# Altium footprint library Inductors SMD.PcbLib: 145 footprints (part 5 of 10)
Each footprint in its own frame and in the unit in brackets; x right, y up, seen from the top. Pads: shape width x height; smd on the part's side, far side on the other; paste and mask are expansions set on the pad; w line width, h text height; cw(c..) or ccw(c..) is an arc to the next point about the centre after c.
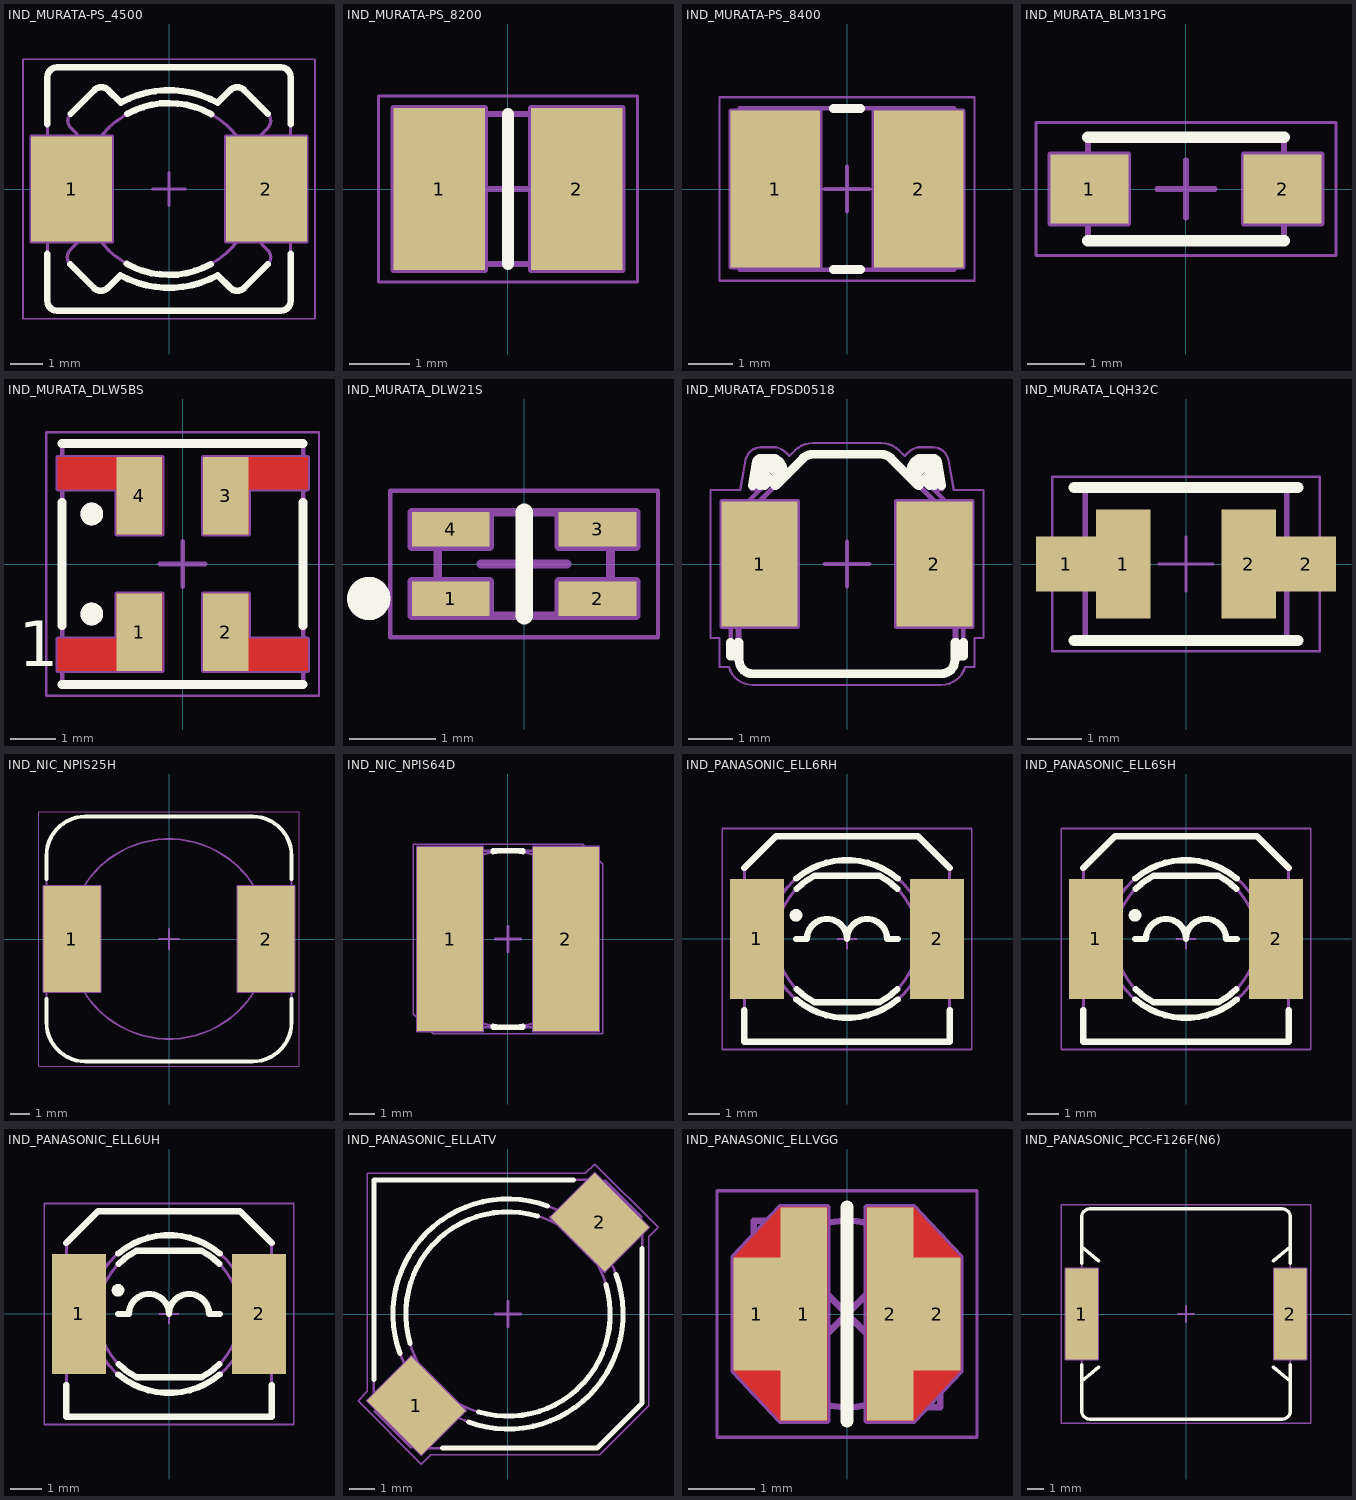
[diagram p4: the footprints below, top view; thin cyan lines are the x and y axes]

## IND_MURATA-PS_4500 [mm] "Shielded Surface Mount Power Inductors, 7.3mm L X 7.3mm W X 3.55mm H, MURATA 4500 Series"
height 3.55
pads (2):
  rect 2.5x3.25 smd: 1(-3,0) 2(3,0)
Top Overlay:
  lines w0.2: -3.75,-2 -3.75,-3.45 ccw(c-3.45,-3.45) -3.45,-3.75 3.45,-3.75 ccw(c3.45,-3.45) 3.75,-3.45 3.75,-2 ; -3.75,2 -3.75,3.45 cw(c-3.45,3.45) -3.45,3.75 3.45,3.75 cw(c3.45,3.45) 3.75,3.45 3.75,2 ; -3.045,-2.323 -2.323,-3.045 ccw(c-2.103,-2.826) -1.883,-3.045 -1.496,-2.658 ccw(c0,0) 1.496,-2.658 1.879,-3.04 ccw(c2.104,-2.825) 2.323,-3.045 3.045,-2.323 ; -3.029,2.323 -2.307,3.045 cw(c-2.087,2.826) -1.863,3.041 -1.486,2.664 cw(c0,0) 1.496,2.658 1.883,3.045 cw(c2.103,2.826) 2.323,3.045 3.045,2.323 ; -1.3,-2.309 ccw(c0,0) 1.291,-2.314 ; -1.291,2.314 cw(c0,0) 1.3,2.309
Top Solder:
  region: 2.85,0.6 1.7,0.6 1.7,-0.6 2.85,-0.6
  rectangle: -2.85,-0.6 -1.7,0.6
Mechanical 8:
  lines w0.1: -3.5,0 -3,0 ; -3,-0.5 -3,0 ; -3,0.5 -3,0 ; -2.5,0 -3,0 ; -0.5,0 0,0 ; 0,-0.5 0,0 ; 0,0.5 0,0 ; 0.5,0 0,0 ; 2.5,0 3,0 ; 3,-0.5 3,0 ; 3,0.5 3,0 ; 3.5,0 3,0 ; -4.25,-1.625 -1.75,-1.625 -1.75,1.625 -4.25,1.625 -4.25,-1.625 ; 1.75,-1.625 1.75,1.625 4.25,1.625 4.25,-1.625 1.75,-1.625
Mechanical 14:
  circle w0.1: c0,0 r2.65
  lines w0.1: -1.5,3.75 1.5,3.75 ; -3.75,-3.45 ccw(c-3.45,-3.45) -3.45,-3.75 3.45,-3.75 ccw(c3.45,-3.45) 3.75,-3.45 3.75,3.45 ccw(c3.45,3.45) 3.45,3.75 -3.45,3.75 ccw(c-3.45,3.45) -3.75,3.45 -3.75,-3.45 ; -3.045,-2.323 cw(c-2.825,-2.104) -3.04,-1.879 -2.658,-1.496 cw(c0,0) -2.652,1.506 -3.029,1.884 cw(c-2.809,2.103) -3.029,2.323 -2.307,3.045 cw(c-2.087,2.826) -1.863,3.041 -1.486,2.664 cw(c0,0) 1.496,2.658 1.883,3.045 cw(c2.103,2.826) 2.323,3.045 3.045,2.323 cw(c2.825,2.104) 3.04,1.879 2.658,1.496 cw(c0,0) 2.658,-1.496 3.045,-1.883 cw(c2.826,-2.103) 3.045,-2.323 2.323,-3.045 cw(c2.104,-2.825) 1.879,-3.04 1.496,-2.658 cw(c0,0) -1.496,-2.658 -1.883,-3.045 cw(c-2.103,-2.826) -2.323,-3.045 -3.045,-2.323
Mechanical 15:
  lines w0.05: -4.5,-4 4.5,-4 4.5,4 -4.5,4 -4.5,-4
3D body "IND_MURATA-PS_4500.stp": height 3.55, standoff 0, extent -3.75,-3.75 3.75,3.75

## IND_MURATA-PS_8200 [mm] "Miniature Surface Mount Power Inductors, 3.2mm L X 2.5mm W X 2.3mm H, MURATA 8200 Series"
height 2.3
pads (2):
  rect 1.52x2.7 smd: 1(-1.145,0) 2(1.145,0)
Top Overlay:
  lines w0.2: 0,-1.25 0,1.25
Mechanical 8:
  lines w0.1: -1.645,0 -1.145,0 ; -1.145,-0.5 -1.145,0 ; -1.145,0.5 -1.145,0 ; -0.645,0 -1.145,0 ; -0.5,0 0,0 ; 0,-0.5 0,0 ; 0,0.5 0,0 ; 0.5,0 0,0 ; 0.645,0 1.145,0 ; 1.145,-0.5 1.145,0 ; 1.145,0.5 1.145,0 ; 1.645,0 1.145,0 ; -1.905,-1.35 -1.905,1.35 -0.385,1.35 -0.385,-1.35 -1.905,-1.35 ; 0.385,-1.35 0.385,1.35 1.905,1.35 1.905,-1.35 0.385,-1.35
Mechanical 14:
  lines w0.1: -1.193,-1.25 cw(c-1.193,-1.15) -1.293,-1.15 -1.293,1.15 cw(c-1.193,1.15) -1.193,1.25 ; 1.193,-1.25 ccw(c1.193,-1.15) 1.293,-1.15 1.293,1.15 ccw(c1.193,1.15) 1.193,1.25 ; -1.6,-1.25 -1.6,1.25 1.6,1.25 1.6,-1.25 -1.6,-1.25
Mechanical 15:
  lines w0.05: -2.155,-1.55 2.155,-1.55 2.155,1.55 -2.155,1.55 -2.155,-1.55
3D body "IND_MURATA-PS_8200.stp": height 2.3, standoff 0, extent -1.6,-1.25 1.6,1.25

## IND_MURATA-PS_8400 [mm] "Miniature Surface Mount Power Inductors, 4.5mm L X 3.3mm W X 2.9mm H, MURATA 8400 Series"
height 2.9
pads (2):
  rect 2x3.5 smd: 1(-1.6,0) 2(1.6,0)
Top Overlay:
  lines w0.2: -0.3,-1.8 0.3,-1.8 ; -0.3,1.8 0.3,1.8
Mechanical 8:
  lines w0.1: -2.1,0 -1.6,0 ; -1.6,-0.5 -1.6,0 ; -1.6,0.5 -1.6,0 ; -1.1,0 -1.6,0 ; -0.5,0 0,0 ; 0,-0.5 0,0 ; 0,0.5 0,0 ; 0.5,0 0,0 ; 1.1,0 1.6,0 ; 1.6,-0.5 1.6,0 ; 1.6,0.5 1.6,0 ; 2.1,0 1.6,0 ; -2.6,-1.75 -0.6,-1.75 -0.6,1.75 -2.6,1.75 -2.6,-1.75 ; 0.6,-1.75 2.6,-1.75 2.6,1.75 0.6,1.75 0.6,-1.75
Mechanical 14:
  lines w0.1: -1.8,-1.8 -1.8,1.8 ; 1.8,-1.8 1.8,1.8 ; -2.4,-1.8 -2.4,1.8 2.4,1.8 2.4,-1.8 -2.4,-1.8
Mechanical 15:
  lines w0.05: -2.85,-2.05 2.85,-2.05 2.85,2.05 -2.85,2.05 -2.85,-2.05
3D body "IND_MURATA-PS_8400.stp": height 2.9, standoff 0, extent -2.4,-1.8 2.4,1.8

## IND_MURATA_BLM31PG [mm] "Chip Ferrite Bead, 3.20mm L X 1.60mm W, BLM31PG Series"
height 1.3
pads (2):
  rect 1.35x1.2 smd: 1(-1.675,0) 2(1.675,0)
Top Overlay:
  lines w0.2: -1.7,-0.9 1.7,-0.9 ; -1.7,0.9 1.7,0.9
Mechanical 8:
  lines w0.1: -2.175,0 -1.675,0 ; -1.675,-0.5 -1.675,0 ; -1.675,0.5 -1.675,0 ; -1.175,0 -1.675,0 ; -0.5,0 0,0 ; 0,-0.5 0,0 ; 0,0.5 0,0 ; 0.5,0 0,0 ; 1.175,0 1.675,0 ; 1.675,-0.5 1.675,0 ; 1.675,0.5 1.675,0 ; 2.175,0 1.675,0 ; -2.35,-0.6 -1,-0.6 -1,0.6 -2.35,0.6 -2.35,-0.6 ; 1,-0.6 2.35,-0.6 2.35,0.6 1,0.6 1,-0.6
Mechanical 14:
  lines w0.1: -1.7,-0.9 -1.7,0.9 1.7,0.9 1.7,-0.9 -1.7,-0.9
Mechanical 15:
  lines w0.05: -2.6,-1.15 -2.6,1.15 2.6,1.15 2.6,-1.15 -2.6,-1.15
3D body "IND_MURATA_BLM31PG.stp": height 1.3, standoff 0, extent -1.6,-0.8 1.6,0.8

## IND_MURATA_DLW5BS [mm] "Common Mode Choke Coil, DLW5BS Series - Body 5.0 x 5.0mm"
height 4.5
pads (4):
  rect 1x1.7 smd: 1(-0.95,-1.5) 2(0.95,-1.5) 3(0.95,1.5) 4(-0.95,1.5)
Top Layer:
  region: -0.45,0.65 -0.45,2.35 -2.75,2.35 -2.75,1.65 -1.45,1.65 -1.45,0.65
  region: 0.45,-0.65 0.45,-2.35 2.75,-2.35 2.75,-1.65 1.45,-1.65 1.45,-0.65
  region: -0.45,-0.65 -0.45,-2.35 -2.75,-2.35 -2.75,-1.65 -1.45,-1.65 -1.45,-0.65
  region: 0.45,0.65 0.45,2.35 2.75,2.35 2.75,1.65 1.45,1.65 1.45,0.65
Top Overlay:
  circle w0.25: c-2,1.1 r0.125
  circle w0.25: c-2,-1.1 r0.125
  lines w0.2: -2.65,-2.65 2.65,-2.65 ; -2.65,-1.35 -2.65,1.35 ; -2.65,2.65 2.65,2.65 ; 2.65,-1.35 2.65,1.35
  text "1" at -3.6,-2.25 h1
Mechanical 8:
  lines w0.1: -1.45,-1.5 -0.95,-1.5 ; -1.45,1.5 -0.95,1.5 ; -0.95,-2 -0.95,-1.5 ; -0.95,-1 -0.95,-1.5 ; -0.95,1 -0.95,1.5 ; -0.95,2 -0.95,1.5 ; -0.5,0 0,0 ; -0.45,-1.5 -0.95,-1.5 ; -0.45,1.5 -0.95,1.5 ; 0,-0.5 0,0 ; 0,0.5 0,0 ; 0.45,-1.5 0.95,-1.5 ; 0.45,1.5 0.95,1.5 ; 0.5,0 0,0 ; 0.95,-2 0.95,-1.5 ; 0.95,-1 0.95,-1.5 ; 0.95,1 0.95,1.5 ; 0.95,2 0.95,1.5 ; 1.45,-1.5 0.95,-1.5 ; 1.45,1.5 0.95,1.5 ; -2.75,-2.35 -0.45,-2.35 -0.45,-0.65 -1.45,-0.65 -1.45,-1.65 -2.75,-1.65 -2.75,-2.35 ; -2.75,1.65 -1.45,1.65 -1.45,0.65 -0.45,0.65 -0.45,2.35 -2.75,2.35 -2.75,1.65 ; 0.45,-2.35 0.45,-0.65 1.45,-0.65 1.45,-1.65 2.75,-1.65 2.75,-2.35 0.45,-2.35 ; 0.45,0.65 1.45,0.65 1.45,1.65 2.75,1.65 2.75,2.35 0.45,2.35 0.45,0.65
Mechanical 14:
  circle w0.25: c-2,-1.1 r0.125
  circle w0.25: c-2,1.1 r0.125
  lines w0.1: -2.65,-2.65 2.65,-2.65 2.65,2.65 -2.65,2.65 -2.65,-2.65
Mechanical 15:
  lines w0.05: -3,-2.9 3,-2.9 3,2.9 -3,2.9 -3,-2.9
3D body "IND_MURATA_DLW5BS.stp": height 4.5, standoff 0, extent -2.65,-2.65 2.65,2.65

## IND_MURATA_DLW21S [mm] "Common Mode Choke Coil, DLW21S Series - Body 2 x 1.2mm"
height 1.4
pads (4):
  rect 0.9x0.4 smd: 1(-0.85,-0.4) 2(0.85,-0.4) 3(0.85,0.4) 4(-0.85,0.4)
Top Overlay:
  circle w0.25: c-1.8,-0.4 r0.125
  lines w0.2: 0,-0.6 0,0.6
Mechanical 8:
  lines w0.1: -0.5,0 0,0 ; 0,-0.5 0,0 ; 0,0.5 0,0 ; 0.5,0 0,0 ; -1.3,-0.6 -0.4,-0.6 -0.4,-0.2 -1.3,-0.2 ; -1.3,-0.6 -1.3,-0.2 ; -1.3,-0.6 -0.85,-0.4 -1.3,-0.2 ; -1.3,0.2 -0.4,0.2 -0.4,0.6 -1.3,0.6 ; -1.3,0.2 -1.3,0.6 ; -1.3,0.2 -0.85,0.4 -1.3,0.6 ; 1.3,-0.6 1.3,-0.2 ; 1.3,-0.6 1.3,-0.2 ; 1.3,-0.6 0.4,-0.6 0.4,-0.2 1.3,-0.2 ; 1.3,-0.6 0.85,-0.4 1.3,-0.2 ; 1.3,0.2 1.3,0.6 ; 1.3,0.2 1.3,0.6 ; 1.3,0.2 0.4,0.2 0.4,0.6 1.3,0.6 ; 1.3,0.2 0.85,0.4 1.3,0.6
Mechanical 14:
  circle w0.25: c-1.8,-0.4 r0.125
  lines w0.1: -1,-0.6 1,-0.6 1,0.6 -1,0.6 -1,-0.6
Mechanical 15:
  lines w0.05: -1.55,-0.85 1.55,-0.85 1.55,0.85 -1.55,0.85 -1.55,-0.85
3D body "IND_MURATA_DLW21S.stp": height 1.4, standoff 0, extent -1,-0.6 1,0.6

## IND_MURATA_FDSD0518 [mm] "Surface Mount Metal alloy Power Inductor, 5.2mm L X 4.9mm W X 1.8mm H, FDSD0518 Series"
height 1.8
pads (2):
  rect 1.7x2.8 smd: 1(-1.95,0) 2(1.95,0)
Top Overlay:
  lines w0.2: -2.6,-1.75 -2.6,-2.05 -2.436,-2.05 -2.436,-1.75 ; -2.408,-1.75 -2.408,-2.151 ccw(c-2.108,-2.151) -2.111,-2.451 2.108,-2.451 ccw(c2.108,-2.151) 2.408,-2.151 2.408,-1.75 ; -2.111,1.75 -2.018,2.276 cw(c-1.919,2.259) -1.92,2.359 -1.638,2.36 cw(c-1.638,2.26) -1.578,2.34 -1.548,2.317 cw(c-1.737,2.065) -1.459,1.917 ; -1.946,1.75 -1.89,2.128 cw(c-1.791,2.113) -1.791,2.213 -1.71,2.213 cw(c-1.71,2.113) -1.64,2.184 -1.629,2.174 cw(c-1.735,2.067) -1.587,2.045 ; -1.845,1.75 -1.708,1.883 ; -1.609,1.75 -1.592,1.767 ; -1.596,1.75 -0.982,2.363 cw(c-0.77,2.151) -0.77,2.451 0.77,2.451 cw(c0.77,2.151) 0.982,2.363 1.596,1.75 ; -1.585,1.76 -1.822,1.997 cw(c-1.752,2.068) -1.681,2.139 -1.444,1.902 ; 1.444,1.902 1.681,2.139 cw(c1.752,2.068) 1.822,1.997 1.585,1.76 ; 1.459,1.917 cw(c1.737,2.065) 1.548,2.317 1.578,2.34 cw(c1.638,2.26) 1.638,2.36 1.92,2.359 cw(c1.919,2.259) 2.018,2.276 2.111,1.75 ; 1.587,2.045 cw(c1.735,2.067) 1.629,2.174 1.64,2.184 cw(c1.71,2.113) 1.71,2.213 1.791,2.213 cw(c1.791,2.113) 1.89,2.128 1.946,1.75 ; 1.592,1.767 1.609,1.75 ; 1.708,1.883 1.845,1.75 ; 2.436,-1.75 2.436,-2.05 2.6,-2.05 2.6,-1.75
Mechanical 8:
  lines w0.1: -2.45,0 -1.95,0 ; -1.95,-0.5 -1.95,0 ; -1.95,0.5 -1.95,0 ; -1.45,0 -1.95,0 ; -0.5,0 0,0 ; 0,-0.5 0,0 ; 0,0.5 0,0 ; 0.5,0 0,0 ; 1.45,0 1.95,0 ; 1.95,-0.5 1.95,0 ; 1.95,0.5 1.95,0 ; 2.45,0 1.95,0 ; -2.8,-1.4 -1.1,-1.4 -1.1,1.4 -2.8,1.4 -2.8,-1.4 ; 1.1,-1.4 2.8,-1.4 2.8,1.4 1.1,1.4 1.1,-1.4
Mechanical 14:
  lines w0.1: -1.708,1.883 -2.6,1.011 -2.6,-2.05 -2.436,-2.05 -2.436,0.938 -1.592,1.767 ; -1.587,2.045 ccw(c-1.735,2.067) -1.629,2.174 -1.64,2.184 ccw(c-1.71,2.113) -1.71,2.213 -1.791,2.213 ccw(c-1.791,2.113) -1.89,2.128 -1.961,1.649 -2.126,1.667 -2.018,2.276 cw(c-1.919,2.259) -1.92,2.359 -1.638,2.36 cw(c-1.638,2.26) -1.578,2.34 -1.548,2.317 cw(c-1.737,2.065) -1.459,1.917 ; -1.585,1.76 -1.822,1.997 cw(c-1.752,2.068) -1.681,2.139 -1.444,1.902 ; 1.444,1.902 1.681,2.139 cw(c1.752,2.068) 1.822,1.997 1.585,1.76 ; 1.459,1.917 cw(c1.737,2.065) 1.548,2.317 1.578,2.34 cw(c1.638,2.26) 1.638,2.36 1.92,2.359 cw(c1.919,2.259) 2.018,2.276 2.126,1.667 1.961,1.649 1.89,2.128 ccw(c1.791,2.113) 1.791,2.213 1.71,2.213 ccw(c1.71,2.113) 1.64,2.184 1.629,2.174 ccw(c1.735,2.067) 1.587,2.045 ; 1.592,1.767 2.436,0.938 2.436,-2.05 2.6,-2.05 2.6,1.011 1.708,1.883 ; -2.408,-2.151 ccw(c-2.108,-2.151) -2.111,-2.451 2.108,-2.451 ccw(c2.108,-2.151) 2.408,-2.151 2.408,0.814 ccw(c2.108,0.814) 2.32,1.026 0.982,2.363 ccw(c0.77,2.151) 0.77,2.451 -0.77,2.451 ccw(c-0.77,2.151) -0.982,2.363 -2.32,1.026 ccw(c-2.106,0.813) -2.408,0.814 -2.408,-2.151
Mechanical 15:
  lines w0.05: -3.05,-1.65 -2.85,-1.65 -2.85,-2.3 -2.638,-2.3 ccw(c-2.108,-2.151) -2.112,-2.701 2.108,-2.701 ccw(c2.108,-2.151) 2.638,-2.3 2.85,-2.3 2.85,-1.65 3.05,-1.65 3.05,1.65 2.383,1.65 2.264,2.32 ccw(c1.919,2.259) 1.92,2.609 1.639,2.61 ccw(c1.638,2.26) 1.428,2.539 1.398,2.517 ccw(c1.737,2.065) 1.289,2.409 1.159,2.54 ccw(c0.77,2.151) 0.77,2.701 -0.77,2.701 ccw(c-0.77,2.151) -1.159,2.54 -1.289,2.409 ccw(c-1.737,2.065) -1.397,2.517 -1.428,2.539 ccw(c-1.638,2.26) -1.638,2.61 -1.92,2.609 ccw(c-1.919,2.259) -2.264,2.32 -2.383,1.65 -3.05,1.65 -3.05,-1.65
3D body "IND_MURATA_FDSD0518.stp": height 1.8, standoff 0, extent -2.6,-2.451 2.6,2.451

## IND_MURATA_LQH32C [mm] "Chip Inductor, 3.40mm L X 2.50mm W X 2.20mm H, MURATA LQH32 Series"
height 2.2
pads (4):
  rect 1.1x1 smd: 1(-2.2,0) 2(2.2,0)
  rect 1x2 smd: 1(-1.15,0) 2(1.15,0)
Top Overlay:
  lines w0.2: -2.05,-1.4 2.05,-1.4 ; -2.05,1.4 2.05,1.4
Mechanical 14:
  lines w0.1: -1.85,-1.35 1.85,-1.35 1.85,1.35 -1.85,1.35 -1.85,-1.35
Mechanical 15:
  lines w0.05: -0.5,0 0.5,0 ; 0,-0.5 0,0.5 ; -2.45,-1.6 2.45,-1.6 2.45,1.6 -2.45,1.6 -2.45,-1.6
3D body "IND_MURATA_LQH32C.stp": height 2.2, standoff 0, extent -1.75,-1.25 1.75,1.25

## IND_NIC_NPIS25H [mm] "Power-Choke Inductor, Body 12.5x12.5mm, NIC NPIS_H Series"
height 6
pads (2):
  rect 2.9x5.4 smd: 1(-4.95,0) 2(4.95,0)
Top Overlay:
  lines w0.2: -6.25,-3.05 -6.25,-4.25 ccw(c-4.25,-4.25) -4.25,-6.25 4.25,-6.25 ccw(c4.25,-4.25) 6.25,-4.25 6.25,-3.05 ; -6.25,3.05 -6.25,4.25 cw(c-4.25,4.25) -4.25,6.25 4.25,6.25 cw(c4.25,4.25) 6.25,4.25 6.25,3.05
Mechanical 8:
  lines w0.1: -5.45,0 -4.95,0 ; -4.95,-0.5 -4.95,0 ; -4.95,0.5 -4.95,0 ; -4.45,0 -4.95,0 ; -0.5,0 0,0 ; 0,-0.5 0,0 ; 0,0.5 0,0 ; 0.5,0 0,0 ; 4.45,0 4.95,0 ; 4.95,-0.5 4.95,0 ; 4.95,0.5 4.95,0 ; 5.45,0 4.95,0 ; -6.4,-2.7 -6.4,2.7 -3.5,2.7 -3.5,-2.7 -6.4,-2.7 ; 3.5,-2.7 6.4,-2.7 6.4,2.7 3.5,2.7 3.5,-2.7
Mechanical 14:
  circle w0.1: c0,0 r5.099
  lines w0.1: -6.25,-4.25 ccw(c-4.25,-4.25) -4.25,-6.25 4.25,-6.25 ccw(c4.25,-4.25) 6.25,-4.25 6.25,4.25 ccw(c4.25,4.25) 4.25,6.25 -4.25,6.25 ccw(c-4.25,4.25) -6.25,4.25 -6.25,-4.25
Mechanical 15:
  lines w0.05: -6.65,-6.5 6.65,-6.5 6.65,6.5 -6.65,6.5 -6.65,-6.5
3D body "IND_NIC_NPIS25H.stp": height 6, standoff 0, extent -6.25,-6.25 6.25,6.25

## IND_NIC_NPIS64D [mm] "Shielded Power Inductor, Body 6.7x6.7mm, NIC NPIS64D Series"
height 4
pads (2):
  rect 2.6x7.3 smd: 1(-2.3,0) 2(2.3,0)
Top Overlay:
  lines w0.2: -0.6,-3.5 0.6,-3.5 ; -0.6,-3.448 ccw(c0,0) 0.6,-3.448 ; -0.6,3.448 cw(c0,0) 0.6,3.448 ; -0.6,3.5 0.6,3.5
Mechanical 8:
  lines w0.1: -2.8,0 -2.3,0 ; -2.3,-0.5 -2.3,0 ; -2.3,0.5 -2.3,0 ; -1.8,0 -2.3,0 ; -0.5,0 0,0 ; 0,-0.5 0,0 ; 0,0.5 0,0 ; 0.5,0 0,0 ; 1.8,0 2.3,0 ; 2.3,-0.5 2.3,0 ; 2.3,0.5 2.3,0 ; 2.8,0 2.3,0 ; -3.6,-3.65 -3.6,3.65 -1,3.65 -1,-3.65 -3.6,-3.65 ; 1,-3.65 1,3.65 3.6,3.65 3.6,-3.65 1,-3.65
Mechanical 14:
  circle w0.1: c0,0 r3.5
  lines w0.1: -3.5,-2.864 -3.5,3.5 2.864,3.5 3.5,2.864 3.5,-3.5 -2.864,-3.5 -3.5,-2.864
Mechanical 15:
  lines w0.05: -3.75,-2.968 -3.75,3.75 2.968,3.75 3.75,2.968 3.75,-3.75 -2.967,-3.75 -3.75,-2.968
3D body "IND_NIC_NPIS64D.stp": height 4, standoff 0, extent -3.5,-3.5 3.5,3.5

## IND_PANASONIC_ELL6RH [mm] "SMD Choke Coil, Body 6.9x6.5mm"
height 2.8
pads (2):
  rect 1.7x3.8 smd: 1(-2.85,0) 2(2.85,0)
Top Overlay:
  circle w0.2: c-1.615,0.75 r0.1
  lines w0.2: -3.25,-2.25 -3.25,-3.25 3.25,-3.25 3.25,-2.25 ; -3.25,2.25 -2.25,3.25 2.25,3.25 3.25,2.25 ; -1.615,0 -1.27,0 cw(c-0.635,0) 0,0 cw(c0.635,0) 1.27,0 1.615,0 ; -1.607,-1.915 ccw(c0,0) 1.607,-1.915 ; -1.607,1.915 cw(c0,0) 1.607,1.915 ; -1.591,-1.591 ccw(c0,0) -1.031,-2 1.031,-2 ccw(c0,0) 1.591,-1.591 ; -1.591,1.591 cw(c0,0) -1.031,2 1.031,2 cw(c0,0) 1.591,1.591
Mechanical 14:
  circle w0.1: c0,0 r2.5
  lines w0.1: -3.25,-1.65 -3.45,-1.65 -3.45,1.65 -3.25,1.65 ; 3.25,-1.65 3.45,-1.65 3.45,1.65 3.25,1.65 ; -3.25,-3.25 3.25,-3.25 3.25,2.25 2.25,3.25 -2.25,3.25 -3.25,2.25 -3.25,-3.25 ; -1.031,-2 cw(c0,0) -1.031,2 1.031,2 cw(c0,0) 1.031,-2 -1.031,-2
Mechanical 15:
  lines w0.05: -0.3,0 0.3,0 ; 0,-0.3 0,0.3 ; -3.95,-3.5 3.95,-3.5 3.95,3.5 -3.95,3.5 -3.95,-3.5
3D body "IND_PANASONIC_ELL6RH.stp": height 2.8, standoff 0, extent -3.45,-3.25 3.45,3.25

## IND_PANASONIC_ELL6SH [mm] "SMD Choke Coil, Body 6.9x6.5mm"
height 3.3
pads (2):
  rect 1.7x3.8 smd: 1(-2.85,0) 2(2.85,0)
Top Overlay:
  circle w0.2: c-1.615,0.75 r0.1
  lines w0.2: -3.25,-2.25 -3.25,-3.25 3.25,-3.25 3.25,-2.25 ; -3.25,2.25 -2.25,3.25 2.25,3.25 3.25,2.25 ; -1.615,0 -1.27,0 cw(c-0.635,0) 0,0 cw(c0.635,0) 1.27,0 1.615,0 ; -1.607,-1.915 ccw(c0,0) 1.607,-1.915 ; -1.607,1.915 cw(c0,0) 1.607,1.915 ; -1.591,-1.591 ccw(c0,0) -1.031,-2 1.031,-2 ccw(c0,0) 1.591,-1.591 ; -1.591,1.591 cw(c0,0) -1.031,2 1.031,2 cw(c0,0) 1.591,1.591
Mechanical 14:
  circle w0.1: c0,0 r2.5
  lines w0.1: -3.25,-1.65 -3.45,-1.65 -3.45,1.65 -3.25,1.65 ; 3.25,-1.65 3.45,-1.65 3.45,1.65 3.25,1.65 ; -3.25,-3.25 3.25,-3.25 3.25,2.25 2.25,3.25 -2.25,3.25 -3.25,2.25 -3.25,-3.25 ; -1.031,-2 cw(c0,0) -1.031,2 1.031,2 cw(c0,0) 1.031,-2 -1.031,-2
Mechanical 15:
  lines w0.05: -0.3,0 0.3,0 ; 0,-0.3 0,0.3 ; -3.95,-3.5 3.95,-3.5 3.95,3.5 -3.95,3.5 -3.95,-3.5
3D body "IND_PANASONIC_ELL6SH.stp": height 3.3, standoff 0, extent -3.45,-3.25 3.45,3.25

## IND_PANASONIC_ELL6UH [mm] "SMD Choke Coil, Body 6.9x6.5mm"
height 5
pads (2):
  rect 1.7x3.8 smd: 1(-2.85,0) 2(2.85,0)
Top Overlay:
  circle w0.2: c-1.615,0.75 r0.1
  lines w0.2: -3.25,-2.25 -3.25,-3.25 3.25,-3.25 3.25,-2.25 ; -3.25,2.25 -2.25,3.25 2.25,3.25 3.25,2.25 ; -1.615,0 -1.27,0 cw(c-0.635,0) 0,0 cw(c0.635,0) 1.27,0 1.615,0 ; -1.607,-1.915 ccw(c0,0) 1.607,-1.915 ; -1.607,1.915 cw(c0,0) 1.607,1.915 ; -1.591,-1.591 ccw(c0,0) -1.031,-2 1.031,-2 ccw(c0,0) 1.591,-1.591 ; -1.591,1.591 cw(c0,0) -1.031,2 1.031,2 cw(c0,0) 1.591,1.591
Mechanical 14:
  circle w0.1: c0,0 r2.5
  lines w0.1: -3.25,-1.65 -3.45,-1.65 -3.45,1.65 -3.25,1.65 ; 3.25,-1.65 3.45,-1.65 3.45,1.65 3.25,1.65 ; -3.25,-3.25 3.25,-3.25 3.25,2.25 2.25,3.25 -2.25,3.25 -3.25,2.25 -3.25,-3.25 ; -1.031,-2 cw(c0,0) -1.031,2 1.031,2 cw(c0,0) 1.031,-2 -1.031,-2
Mechanical 15:
  lines w0.05: -0.3,0 0.3,0 ; 0,-0.3 0,0.3 ; -3.95,-3.5 3.95,-3.5 3.95,3.5 -3.95,3.5 -3.95,-3.5
3D body "IND_PANASONIC_ELL6UH.stp": height 5, standoff 0, extent -3.45,-3.25 3.45,3.25

## IND_PANASONIC_ELLATV [mm] "SMD Wire Wound Power Inductor, Body 10x10mm, ELLATV Series"
height 4.5
pads (2):
  rect 2.45x3 smd rot 45: 1(-3.589,-3.589) 2(3.589,3.589)
Top Overlay:
  lines w0.2: -5.25,-2.563 -5.25,5.25 2.563,5.25 ; -4.228,-1.541 cw(c0,0) 1.541,4.228 ; -3.832,-1.145 cw(c0,0) 1.146,3.832 ; -2.563,-5.25 3.482,-5.25 5.25,-3.482 5.25,2.563 ; -1.541,-4.228 ccw(c0,0) 4.228,1.541 ; -1.145,-3.832 ccw(c0,0) 3.833,1.145
Mechanical 8:
  lines w0.1: -3.942,-3.942 -3.589,-3.589 ; -3.942,-3.235 -3.589,-3.589 ; -3.235,-3.942 -3.589,-3.589 ; -3.235,-3.235 -3.589,-3.589 ; -0.5,0 0,0 ; 0,-0.5 0,0 ; 0,0.5 0,0 ; 0.5,0 0,0 ; 3.235,3.235 3.589,3.589 ; 3.235,3.942 3.589,3.589 ; 3.942,3.235 3.589,3.589 ; 3.942,3.942 3.589,3.589 ; -5.515,-3.394 -3.783,-1.662 -1.662,-3.783 -3.394,-5.515 -5.515,-3.394 ; 1.662,3.783 3.394,5.515 5.515,3.394 3.783,1.662 1.662,3.783
Mechanical 14:
  circle w0.1: c0,0 r4.5
  circle w0.1: c0,0 r4
  lines w0.1: -5.215,-3.8 -3.8,-5.215 -2.395,-3.81 ; -5.073,-3.659 -5.25,-3.482 -5.25,5.25 3.482,5.25 3.659,5.073 ; -3.659,-5.073 -3.482,-5.25 3.482,-5.25 5.25,-3.482 5.25,3.482 5.073,3.659 ; 2.395,3.81 3.8,5.215 5.215,3.8 3.81,2.395
Mechanical 15:
  lines w0.05: -5.869,-3.394 -5.5,-3.025 -5.5,5.5 3.025,5.5 3.394,5.869 5.869,3.394 5.5,3.025 5.5,-3.586 3.586,-5.5 -3.025,-5.5 -3.394,-5.869 -5.869,-3.394
3D body "IND_PANASONIC_ELLATV.stp": height 4.5, standoff 0, extent -5.25,-5.25 5.25,5.25

## IND_PANASONIC_ELLVGG [mm] "Wire Wound SMD Power Inductor, Body Width 3mm Body Lenght 3mm Height 1.5mm, PANASONIC G Series"
height 1.5
pads (4):
  rect 0.7x1.7 smd: 1(-1.35,0) 2(1.35,0)
  rect 0.7x3.2 smd: 1(-0.65,0) 2(0.65,0)
Top Layer:
  region: 0.3,-1.6 0.3,1.6 1,1.6 1.7,0.85 1.7,-0.85 1,-1.6
  region: -1,-1.6 -1.7,-0.85 -1.7,0.85 -1,1.6 -0.3,1.6 -0.3,-1.6
Top Overlay:
  lines w0.2: 0,-1.6 0,1.6
Mechanical 8:
  lines w0.1: -1.5,0 -1,0 ; -1,-0.5 -1,0 ; -1,0.5 -1,0 ; -0.5,0 -1,0 ; -0.354,-0.354 0,0 ; -0.354,0.354 0,0 ; 0.354,-0.354 0,0 ; 0.354,0.354 0,0 ; 0.5,0 1,0 ; 1,-0.5 1,0 ; 1,0.5 1,0 ; 1.5,0 1,0 ; -1.7,-0.85 -1,-1.6 -0.3,-1.6 -0.3,1.6 -1,1.6 -1.7,0.85 -1.7,-0.85 ; 0.3,-1.6 0.3,1.6 1,1.6 1.7,0.85 1.7,-0.85 1,-1.6 0.3,-1.6
Mechanical 14:
  circle w0.1: c0,0 r1.4
  lines w0.1: -0.4,-1.342 -0.4,-1.5 -0.712,-1.5 -0.956,-1.239 -1.146,-1.429 -1.429,-1.146 -1.229,-0.946 -1.4,-0.763 -1.4,-0.5 -1.5,-0.5 -1.5,0 -1.5,0.5 -1.4,0.5 -1.4,0.763 -1.297,0.873 -1.4,0.976 -1.4,1.4 -0.976,1.4 -0.888,1.312 -0.712,1.5 -0.4,1.5 -0.4,1.342 ; 0.4,-1.342 0.4,-1.5 0.712,-1.5 0.888,-1.312 0.976,-1.4 1.4,-1.4 1.4,-0.976 1.297,-0.873 1.4,-0.763 1.4,-0.5 1.5,-0.5 1.5,0 1.5,0.5 1.4,0.5 1.4,0.763 1.229,0.946 1.429,1.146 1.146,1.429 0.956,1.239 0.712,1.5 0.4,1.5 0.4,1.342
Mechanical 15:
  lines w0.05: -1.95,-1.85 -1.95,1.85 1.95,1.85 1.95,-1.85 -1.95,-1.85
3D body "IND_PANASONIC_ELLVGG.stp": height 1.5, standoff 0, extent -1.5,-1.5 1.5,1.5

## IND_PANASONIC_PCC-F126F(N6) [mm] "SMD Inductor  Body Width 12.5mm Body Lenght 12.5mm Height 5.7mm, PANASONIC PCC-F126(N6) Series"
height 5.7
pads (2):
  rect 2x5.6 smd: 1(-6.4,0) 2(6.4,0)
Top Overlay:
  lines w0.2: -6.4,-4.125 -5.35,-3.25 ; -6.4,-3.1 -6.4,-5.95 ccw(c-5.9,-5.95) -5.9,-6.45 5.9,-6.45 ccw(c5.9,-5.95) 6.4,-5.95 6.4,-3.1 ; -6.4,3.1 -6.4,5.95 cw(c-5.9,5.95) -5.9,6.45 5.9,6.45 cw(c5.9,5.95) 6.4,5.95 6.4,3.1 ; -6.4,4.125 -5.35,3.25 ; 5.35,-3.25 6.4,-4.125 ; 5.35,3.25 6.4,4.125
Mechanical 8:
  lines w0.1: -6.9,0 -6.4,0 ; -6.4,-0.5 -6.4,0 ; -6.4,0.5 -6.4,0 ; -5.9,0 -6.4,0 ; -0.5,0 0,0 ; 0,-0.5 0,0 ; 0,0.5 0,0 ; 0.5,0 0,0 ; 5.9,0 6.4,0 ; 6.4,-0.5 6.4,0 ; 6.4,0.5 6.4,0 ; 6.9,0 6.4,0 ; -7.4,-2.8 -7.4,2.8 -5.4,2.8 -5.4,-2.8 -7.4,-2.8 ; 5.4,-2.8 5.4,2.8 7.4,2.8 7.4,-2.8 5.4,-2.8
Mechanical 14:
  lines w0.1: -6.4,-5.95 ccw(c-5.9,-5.95) -5.9,-6.45 5.9,-6.45 ccw(c5.9,-5.95) 6.4,-5.95 6.4,5.95 ccw(c5.9,5.95) 5.9,6.45 -5.9,6.45 ccw(c-5.9,5.95) -6.4,5.95 -6.4,-5.95
Mechanical 15:
  lines w0.1: -7.65,-6.7 7.65,-6.7 7.65,6.7 -7.65,6.7 -7.65,-6.7
3D body "IND_PANASONIC_PCC-F126F(N6).stp": height 5.7, standoff -0.3, extent -6.25,-6.25 6.25,6.25